# Altium footprint library myPcb.PcbLib: 80 footprints (part 2 of 5)
Each footprint in its own frame and in the unit in brackets; x right, y up, seen from the top. Pads: shape width x height; smd on the part's side, far side on the other; paste and mask are expansions set on the pad; w line width, h text height; cw(c..) or ccw(c..) is an arc to the next point about the centre after c.
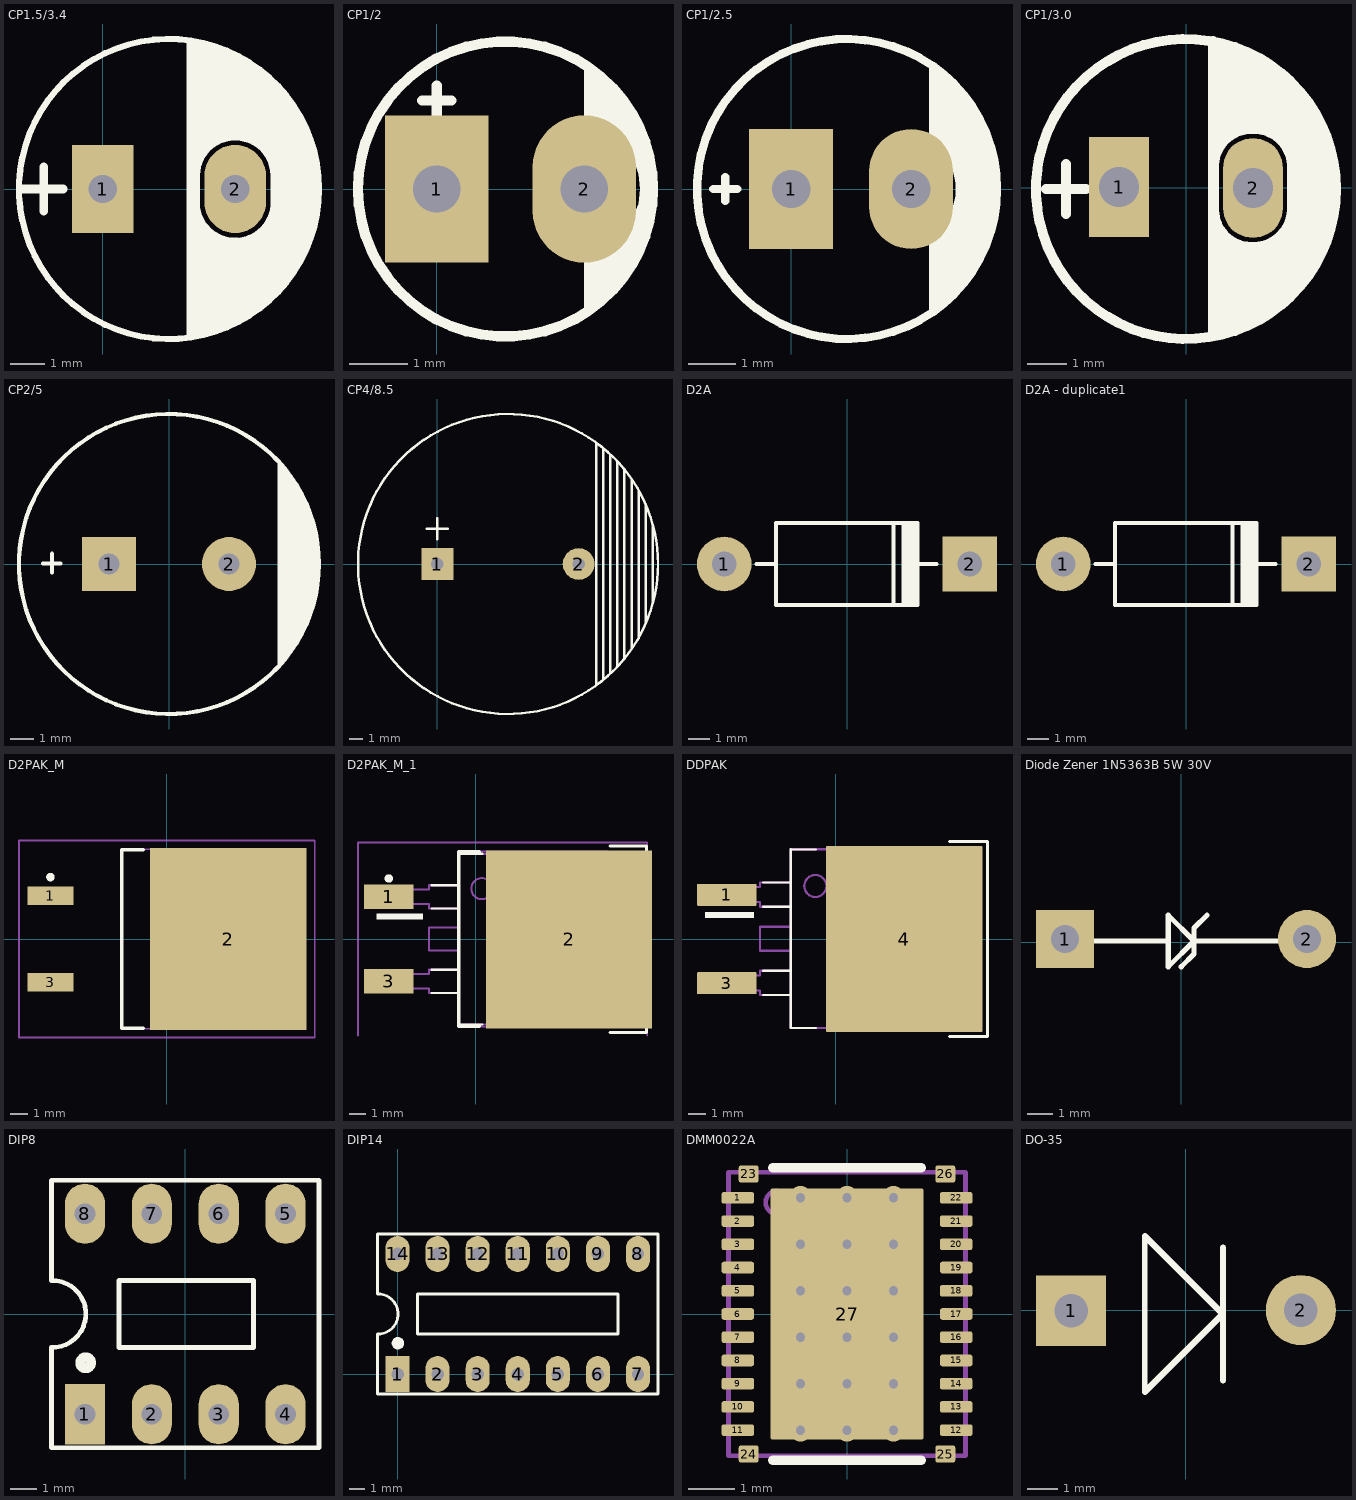
[diagram p1: the footprints below, top view; thin cyan lines are the x and y axes]

## CP1.5/3.4 [mil] "Tu hoa 220->470uF,16V, 470uF/16V,25V"
height 300
pads (2):
  rect 70x100 hole 32: 1(0,0)
  oval 70x100 hole 32: 2(150,0)
Top Overlay:
  circle w7: c75,0 r170
  region: 100,25 135,60 162.93,60.33 169.59,59.01 175.24,55.24 175,55 181.63,48.7 184.3,44.71 185.24,40 185,40 190.24,35.24 194.01,29.59 195.33,22.93 195,22.93 195.33,-27.93 194.01,-34.59 190.24,-40.24 190,-40 178.7,-51.63 174.71,-54.3 170,-55.24 170.24,-55.24 164.59,-59.01 157.93,-60.33 157.93,-60 144.14,-60.29 135.23,-59.12 126.92,-55.68 119.79,-50.21 120,-50 108.37,-38.7 105.7,-34.71 104.76,-30 105,-30 100,-30 100,-170 155,-150 195,-120 225,-80 245,-20 245,20 230,70 200,115 165,145 120,165 100,170
  lines w10: -90,0 -45,0 ; -67,-25 -67,25 ; 100,-165 100,165 ; 100,25 105,25 ; 105,-20 105,30 ; 105,-10 ccw(c150,-15) 145,-60 ccw(c150,-15) 195,-20 195,15 ccw(c150,15) 150,60 ccw(c150,15) 105,15
3D body: height 445.89, standoff -754.41, extent -84.96,-157.48 230,157.48

## CP1/2 [mil] "Tu hoa < 22uF/16>50V"
height 300
pads (2):
  rect 70x100 hole 32: 1(0,0)
  oval 70x100 hole 32: 2(100,0)
Top Overlay:
  circle w7: c46.58,0 r100
  region: 100,84 100,38 112,36 122,32 129,27 134,19 137,10 138,0 137,-10 134,-17 129,-24 123,-31 117,-35 107,-38 100,-38 100,-85 108,-78 120,-69 128,-59 137,-44 144,-19 146,9 139,40 127,60 110,79
  lines w7: -10,60 10,60 ; 0,50 0,70
3D body: height 287.03, standoff -138.05, extent -49.42,-99.42 149.42,99.42

## CP1/2.5 [mil] "Tu hoa 33 >100 uF,50V, 220uF/16V,25V"
height 300
pads (2):
  rect 70x100 hole 32: 1(0,0)
  oval 70x100 hole 32: 2(100,0)
Top Overlay:
  circle w7: c46.58,0 r125
  region: 115,105 115,36 122,31 129,25 133,20 135,15 137,5 137,-6 135,-14 132,-19 128,-24 124,-28 120,-31 115,-34 115,-107 124,-99 139,-86 152,-69 167,-36 171,-15 171.58,0 167,30 153,67 131,93
  lines w7: -65,0 -45,0 ; -55,-10 -55,-5 -55,5 -55,10
3D body: height 421.54, standoff -759.57, extent -76,-124.03 172.03,124

## CP1/3.0 [mil]
height 300
pads (2):
  rect 60x100 hole 40: 1(-67,0.5)
  oval 60x100 hole 40: 2(67,-0.5)
Top Overlay:
  circle w10: c0,-1.5 r150
  region: 27,147.5 27,38.5 55,59.5 77,59.5 99,43.5 108,-1.5 100,-41.5 75,-60.5 40,-51.5 26,-34.5 27,-148.5 86,-126.5 142,-58.5 150,17.5 119,94.5 73,130.5
  lines w10: -140,-1.5 -100,-1.5 ; -120,-26.5 -120,23.5 ; 27,-145.5 27,146.5 ; 28,-25.5 28,23.5 cw(c65.5,21) 65.01,58.58 ; 28,-23.5 ccw(c65.5,-22) 67,-59.5 ccw(c67.5,-21) 106,-21.5 ; 65,58.5 cw(c68,20.5) 106,23.5 ; 106,-28.5 106,26.5
3D body: height 452.87, standoff -747.43, extent -156,-160.98 158.96,153.98

## CP2/5 [mil] "Tu hoa 1000uF/25V,50V"
height 600
pads (2):
  rect 90x90 hole 35: 1(-100,0)
  round 90 hole 35: 2(100,0)
Top Overlay:
  circle w7: c0,0 r250
  region: 181,174 181,-175 200,-149 201,-151 218,-124 234,-90 249,-29 250,0 248,34 241,70 221,116
  lines w7: -210,1 -181,1 ; -195,-14 -195,17
3D body: height 984.37, standoff -747.43, extent -241.06,-247.12 251.06,245

## CP4/8.5 [mil] "Tu hoa 4700uF/50V"
height 600
pads (2):
  rect 90x90 hole 35: 1(0,0)
  round 90 hole 35: 2(400,0)
Top Overlay:
  circle w7: c200,0 r425
  lines w7: -30,100 30,100 ; 0,70 0,130 ; 450,-340 450,340 ; 470,-325 470,325 ; 490,-310 490,310 ; 510,-290 510,290 ; 530,-265 530,265 ; 550,-240 550,240 ; 570,-210 570,205 ; 590,-165 590,170
  lines w8: 610,-110 610,110
3D body: height 984.25, standoff 0, extent -236.14,-438.07 630,428.07

## D2A [mil] "Diode 2A, W 150mil, L 450mil"
height 100
pads (2):
  round 100 hole 45: 1(-225,0)
  rect 100x100 hole 45: 2(225,0)
Top Overlay:
  region: 130,75 100,75 100,-75 130,-75
  lines w7: -166,0 -130,0 ; 85,-75 85,75 ; 129,-32 129,0 ; 129,31 129,0 ; 164,0 129,0 ; -130,-75 129,-75 129,75 -130,75 -130,-75
3D body: height 100.5, standoff -100, extent -210,-54 220,47

## D2A - duplicate1 [mil]
pads (2):
  round 100 hole 45: 1(-225,0)
  rect 100x100 hole 45: 2(225,0)
Top Overlay:
  region: 130,75 100,75 100,-75 130,-75
  lines w7: -166,0 -130,0 ; 85,-75 85,75 ; 129,-32 129,0 ; 129,31 129,0 ; 164,0 129,0 ; -130,-75 129,-75 129,75 -130,75 -130,-75
3D body: height 100.5, standoff -100, extent -210,-54 220,47

## D2PAK_M [mm] "D2-PAK, 4-Leads, Body 8.8x10.4mm, Pitch 2.54mm, Lead Span 15.1mm, IPC Low Density"
height 4.69
pads (3):
  rect 2.7x1.1 smd: 1(-6.85,2.54) 3(-6.85,-2.54)
  rect 9.2x10.7 smd: 2(3.6,0)
Top Overlay:
  circle w0.25: c-6.85,3.64 r0.125
  lines w0.2: -1.4,-5.25 -2.65,-5.25 -2.65,5.25 -1.4,5.25
Mechanical 13:
  lines w0.1: -2.65,-5.275 -2.65,5.275 6.35,5.275 6.35,-5.275 -2.65,-5.275
Mechanical 15:
  lines w0.1: -0.5,0 0.5,0 ; 0,-0.5 0,0.5 ; -8.7,-5.8 -8.7,5.8 8.7,5.8 8.7,-5.8 -8.7,-5.8
3D body: height 4.69, standoff 0, extent -2.65,-5.275 6.35,5.275

## D2PAK_M_1 [mm]
pads (3):
  rect 3x1.5 smd: 1(-5.225,2.54) 3(-5.225,-2.54)
  rect 10x10.7 smd: 2(5.613,-0.025)
Top Overlay:
  circle w0.25: c-5.225,3.64 r0.125
  rectangle: -5.969,1.183 -3.169,1.533
  lines w0.127: -2.644,-3.237 -1.044,-3.237 ; -2.644,-1.847 -1.044,-1.847 ; -2.644,1.843 -1.044,1.843 ; -2.644,3.233 -1.044,3.233 ; -1.044,5.138 -1.044,5.128 ; 0.406,-5.142 -1.044,-5.142 -1.044,-5.132 ; 0.406,-5.132 -1.044,-5.132 ; 0.406,5.128 -1.044,5.128 ; -1.044,-5.132 -1.044,5.128
  lines w0.178: 8.086,-5.617 10.268,-5.617 10.268,5.583 8.086,5.583
  lines w0.2: 0.225,-5.25 -1.025,-5.25 -1.025,5.25 0.225,5.25
Top Paste:
  rectangle: 1.081,-5.242 2.3,-3.748
  rectangle: 2.6,-5.242 3.819,-3.748
  rectangle: 4.119,-5.242 5.338,-3.748
  rectangle: 5.638,-5.242 6.857,-3.748
  rectangle: 7.157,-5.242 8.376,-3.748
  rectangle: 8.676,-5.242 9.895,-3.748
  rectangle: 8.676,-3.448 9.895,-1.954
  rectangle: 7.157,-3.448 8.376,-1.954
  rectangle: 5.638,-3.448 6.857,-1.954
  rectangle: 4.119,-3.448 5.338,-1.954
  rectangle: 2.6,-3.448 3.819,-1.954
  rectangle: 1.081,-3.448 2.3,-1.954
  rectangle: 8.676,-1.654 9.895,-0.16
  rectangle: 7.157,-1.654 8.376,-0.16
  rectangle: 5.638,-1.654 6.857,-0.16
  rectangle: 4.119,-1.654 5.338,-0.16
  rectangle: 2.6,-1.654 3.819,-0.16
  rectangle: 1.081,-1.654 2.3,-0.16
  rectangle: 8.676,0.14 9.895,1.634
  rectangle: 7.157,0.14 8.376,1.634
  rectangle: 5.638,0.14 6.857,1.634
  rectangle: 4.119,0.14 5.338,1.634
  rectangle: 2.6,0.14 3.819,1.634
  rectangle: 1.081,0.14 2.3,1.634
  rectangle: 8.676,1.934 9.895,3.428
  rectangle: 7.157,1.934 8.376,3.428
  rectangle: 5.638,1.934 6.857,3.428
  rectangle: 4.119,1.934 5.338,3.428
  rectangle: 2.6,1.934 3.819,3.428
  rectangle: 1.081,1.934 2.3,3.428
  rectangle: 8.676,3.728 9.895,5.222
  rectangle: 7.157,3.728 8.376,5.222
  rectangle: 5.638,3.728 6.857,5.222
  rectangle: 4.119,3.728 5.338,5.222
  rectangle: 2.6,3.728 3.819,5.222
  rectangle: 1.081,3.728 2.3,5.222
Mechanical 5:
  lines w0.127: -1.044,-3.237 -2.814,-3.237 -2.814,-2.972 -3.124,-2.972 -4.154,-2.972 ; -1.044,-1.847 -2.814,-1.847 -2.814,-2.112 -3.124,-2.112 -4.154,-2.112 ; -1.044,-0.697 -2.814,-0.697 -2.814,0.693 -1.044,0.693 ; -1.044,1.843 -2.814,1.843 -2.814,2.108 -3.124,2.108 -4.154,2.108 ; -1.044,3.233 -2.814,3.233 -2.814,2.968 -3.124,2.968 -4.154,2.968 ; 8.349,-5.132 9.326,-5.132 9.746,-4.002 9.746,3.998 9.326,5.128 8.349,5.128 ; -4.154,-2.972 -4.154,-2.112 ; -4.154,-2.972 -4.724,-2.972 -5.994,-2.972 -5.994,-2.112 -4.724,-2.112 -4.154,-2.112 ; -4.154,2.108 -4.724,2.108 -5.994,2.108 -5.994,2.968 -4.724,2.968 -4.154,2.968 ; -4.154,2.108 -4.154,2.968 ; -1.044,-5.132 -1.044,-5.142 8.349,-5.142 ; -1.044,-5.132 -1.044,5.128 ; -1.044,-5.132 7.606,-5.132 ; -1.044,5.128 7.606,5.128 ; -1.044,5.128 -1.044,5.138 8.349,5.138 ; 7.606,-5.132 8.349,-5.142 ; 7.606,-5.132 7.606,5.128 ; 7.606,5.128 8.349,5.138 ; 8.349,-5.142 8.349,5.138 ; -0.262,3.03 ccw(c0.373,3.03) 1.008,3.03 ccw(c0.373,3.03) -0.262,3.03
Mechanical 13:
  lines w0.1: -1.025,-5.275 -1.025,5.275 7.975,5.275 7.975,-5.275 -1.025,-5.275
Mechanical 15:
  lines w0.1: -7.075,-5.8 -7.075,5.8 10.325,5.8 10.325,-5.8 ; 1.125,0 2.125,0 ; 1.625,-0.5 1.625,0.5
3D body: height 4.58, standoff 0, extent -5.969,-5.157 9.771,5.123

## DDPAK [mil] "D2-PAK, 3-Pads, Body 9.7x10.4mm (max), TO-263AB, using Vishay Silionix recommended pad sizes"
height 190
pads (3):
  rrect8% 135x49.49 smd: 1(-246.06,100) 3(-246.06,-100)
  rrect1% 355x420 smd paste-181.1: 4(155.51,0)
Top Overlay:
  rectangle: -295.27,47.24 -185.03,61.02
  lines w5: -164.37,-126.77 -101.38,-126.77 ; -164.37,-72.05 -101.38,-72.05 ; -164.37,73.23 -101.38,73.23 ; -164.37,127.95 -101.38,127.95 ; -101.38,202.95 -101.38,202.56 ; -44.29,-201.77 -101.38,-201.77 -101.38,-201.38 ; -44.29,-201.38 -101.38,-201.38 ; -44.29,202.56 -101.38,202.56 ; -101.38,-201.38 -101.38,202.56
  lines w7: 258.09,-220.47 344,-220.47 344,220.47 258.09,220.47
Top Paste:
  rectangle: -17.72,-205.71 30.28,-146.89
  rectangle: 42.09,-205.71 90.08,-146.89
  rectangle: 101.89,-205.71 149.88,-146.89
  rectangle: 161.69,-205.71 209.68,-146.89
  rectangle: 221.49,-205.71 269.49,-146.89
  rectangle: 281.3,-205.71 329.29,-146.89
  rectangle: 281.3,-135.08 329.29,-76.26
  rectangle: 221.49,-135.08 269.49,-76.26
  rectangle: 161.69,-135.08 209.68,-76.26
  rectangle: 101.89,-135.08 149.88,-76.26
  rectangle: 42.09,-135.08 90.08,-76.26
  rectangle: -17.72,-135.08 30.28,-76.26
  rectangle: 281.3,-64.45 329.29,-5.63
  rectangle: 221.49,-64.45 269.49,-5.63
  rectangle: 161.69,-64.45 209.68,-5.63
  rectangle: 101.89,-64.45 149.88,-5.63
  rectangle: 42.09,-64.45 90.08,-5.63
  rectangle: -17.72,-64.45 30.28,-5.63
  rectangle: 281.3,6.18 329.29,65
  rectangle: 221.49,6.18 269.49,65
  rectangle: 161.69,6.18 209.68,65
  rectangle: 101.89,6.18 149.88,65
  rectangle: 42.09,6.18 90.08,65
  rectangle: -17.72,6.18 30.28,65
  rectangle: 281.3,76.81 329.29,135.63
  rectangle: 221.49,76.81 269.49,135.63
  rectangle: 161.69,76.81 209.68,135.63
  rectangle: 101.89,76.81 149.88,135.63
  rectangle: 42.09,76.81 90.08,135.63
  rectangle: -17.72,76.81 30.28,135.63
  rectangle: 281.3,147.44 329.29,206.26
  rectangle: 221.49,147.44 269.49,206.26
  rectangle: 161.69,147.44 209.68,206.26
  rectangle: 101.89,147.44 149.88,206.26
  rectangle: 42.09,147.44 90.08,206.26
  rectangle: -17.72,147.44 30.28,206.26
Mechanical 5:
  lines w5: -101.38,-126.77 -171.06,-126.77 -171.06,-116.34 -183.27,-116.34 -223.81,-116.34 ; -101.38,-72.05 -171.06,-72.05 -171.06,-82.48 -183.27,-82.48 -223.81,-82.48 ; -101.38,-26.77 -171.06,-26.77 -171.06,27.95 -101.38,27.95 ; -101.38,73.23 -171.06,73.23 -171.06,83.66 -183.27,83.66 -223.81,83.66 ; -101.38,127.95 -171.06,127.95 -171.06,117.52 -183.27,117.52 -223.81,117.52 ; 268.43,-201.38 306.93,-201.38 323.43,-156.89 323.43,158.07 306.93,202.56 268.43,202.56 ; -223.81,-116.34 -223.81,-82.48 ; -223.81,-116.34 -246.26,-116.34 -296.26,-116.34 -296.26,-82.48 -246.26,-82.48 -223.81,-82.48 ; -223.81,83.66 -246.26,83.66 -296.26,83.66 -296.26,117.52 -246.26,117.52 -223.81,117.52 ; -223.81,83.66 -223.81,117.52 ; -101.38,-201.38 -101.38,-201.77 268.43,-201.77 ; -101.38,-201.38 -101.38,202.56 ; -101.38,-201.38 239.17,-201.38 ; -101.38,202.56 239.17,202.56 ; -101.38,202.56 -101.38,202.95 268.43,202.95 ; 239.17,-201.38 268.43,-201.77 ; 239.17,-201.38 239.17,202.56 ; 239.17,202.56 268.43,202.95 ; 268.43,-201.77 268.43,202.95 ; -70.58,119.94 ccw(c-45.58,119.94) -20.58,119.94 ccw(c-45.58,119.94) -70.58,119.94
  text ".Designator" at -60,-20 h40
3D body: height 180.31, standoff 0, extent -295.27,-202.36 324.41,202.36

## Diode Zener 1N5363B 5W 30V [mil]
height 300
pads (2):
  rect 90x90 hole 43.31: 1(-180,5)
  round 90 hole 43.31: 2(195,5)
Top Overlay:
  lines w8: -175,1.89 -19.96,1.89 ; 0.04,-38.11 20.04,-18.11 20.04,1.89 ; 40.04,41.89 20.04,21.89 20.04,1.89 ; 185,1.89 20.04,1.89 ; 20.04,1.89 -19.96,-38.11 -19.96,41.89 20.04,1.89
3D body: height 84.5, standoff -100, extent -200.49,-29 220.49,40

## DIP8 [mil]
height 104.33
pads (8):
  rect 60x90 hole 31: 1(-150,-150)
  oval 60x90 hole 31: 2(-50,-150) 3(50,-150) 4(150,-150) 5(150,150) 6(50,150) 7(-50,150) 8(-150,150)
Top Overlay:
  circle w15: c-149,-73 r8
  lines w7: -200.38,-49.95 ccw(c-198.69,0.02) -200,50 ; -200,-50 -200,-200 200,-200 200,200 -200,200 -200,51 ; -99,-50 102,-50 102,50 -99,50 -99,-50
3D body: height 201.25, standoff -129.47, extent -200,-190 200,186.4

## DIP14 [mil] "DIP, 14-Leads, Row Spacing 7.62mm, Pitch 2.54mm, Body 19.2x6.6mm"
height 100
pads (14):
  rect 60x90 hole 31: 1(0,0)
  oval 60x90 hole 31: 2(100,0) 3(200,0) 4(300,0) 5(400,0) 6(500,0) 7(600,0) 8(600,300) 9(500,300) 10(400,300) 11(300,300) 12(200,300) 13(100,300) 14(0,300)
Top Overlay:
  circle w15: c1,77 r8
  lines w7: -50.38,100.05 ccw(c-48.69,150.02) -50,200 ; -50,100 -50,-50 650,-50 650,350 -50,350 -50,201 ; 50,100 550,100 550,200 50,200 50,100
3D body: height 145.48, standoff -129.32, extent -69.99,-12.47 680.01,302.49

## DMM0022A [mm] "SON, 27-Leads, Body 5x6mm, Pitch 0.5mm"
height 1.05
pads (35):
  rrect40% 0.7x0.25 smd: 1(-2.35,2.5) 2(-2.35,2) 21(2.35,2) 22(2.35,2.5)
  rrect40% 0.7x0.25 smd mask+0: 3(-2.35,1.5) 4(-2.35,1) 5(-2.35,0.5) 6(-2.35,0) 7(-2.35,-0.5) 8(-2.35,-1) 9(-2.35,-1.5) 10(-2.35,-2) 11(-2.35,-2.5) 12(2.35,-2.5) 13(2.35,-2) 14(2.35,-1.5) 15(2.35,-1) 16(2.35,-0.5) 17(2.35,0) 18(2.35,0.5) 19(2.35,1) 20(2.35,1.5)
  rrect27% 0.43x0.375 smd: 23(-2.115,3.013) 24(-2.115,-3.013) 25(2.115,-3.013) 26(2.115,3.013)
  rrect3% 3.3x5.4 smd paste-1.65: 27(0,0)
  rrect50% 1.41x1.12 on Top Paste: ""(-0.805,-1.98) ""(-0.805,-0.66) ""(-0.805,0.66) ""(-0.805,1.98) ""(0.805,-1.98) ""(0.805,-0.66) ""(0.805,0.66) ""(0.805,1.98)
via 1,0.501 diameter 0.5 hole 0.2
via 1,1.501 diameter 0.5 hole 0.2
via 1,-1.499 diameter 0.5 hole 0.2
via 1,-0.499 diameter 0.5 hole 0.2
via 1,-2.499 diameter 0.5 hole 0.2
via 0,0.501 diameter 0.5 hole 0.2
via 0,1.501 diameter 0.5 hole 0.2
via 0,-1.499 diameter 0.5 hole 0.2
via 0,-0.499 diameter 0.5 hole 0.2
via 0,-2.499 diameter 0.5 hole 0.2
via -1,-2.499 diameter 0.5 hole 0.2
via -1,-0.499 diameter 0.5 hole 0.2
via -1,-1.499 diameter 0.5 hole 0.2
via -1,1.501 diameter 0.5 hole 0.2
via -1,0.501 diameter 0.5 hole 0.2
via -1,2.501 diameter 0.5 hole 0.2
via 1,2.501 diameter 0.5 hole 0.2
via 0,2.501 diameter 0.5 hole 0.2
Top Overlay:
  lines w0.2: -1.6,-3.15 1.6,-3.15 ; -1.6,3.15 1.6,3.15
Mechanical 5:
  circle w0.1: c-1.5,2.4 r0.25
  lines w0.1: -2.55,-3.05 2.55,-3.05 2.55,3.05 -2.55,3.05 -2.55,-3.05
  text ".Designator" at 0.059,-0.643 h0.64
3D body: height 1.05, standoff 1.05, extent -1.754,2.146 -1.246,2.654
3D body: height 1.05, standoff 0, extent -2.55,-3.05 2.55,3.05

## DO-35 [mil]
height 70.87
pads (2):
  rect 90x90 hole 43: 1(-147.3,-0.45)
  round 90 hole 43: 2(147.3,0.45)
Top Overlay:
  lines w7: -52.7,-104.55 -52.7,95.45
  lines w8: -52.7,-104.55 47.3,-4.55 -52.7,95.45 ; 47.3,-89.55 47.3,80.45
3D body: height 87.01, standoff -70.87, extent -167.94,-39.31 152.54,40.21